# Altium footprint library connectors_socets.pcblib: 567 footprints (part 29 of 36)
Each footprint in its own frame and in the unit in brackets; x right, y up, seen from the top. Pads: shape width x height; smd on the part's side, far side on the other; paste and mask are expansions set on the pad; w line width, h text height; cw(c..) or ccw(c..) is an arc to the next point about the centre after c.
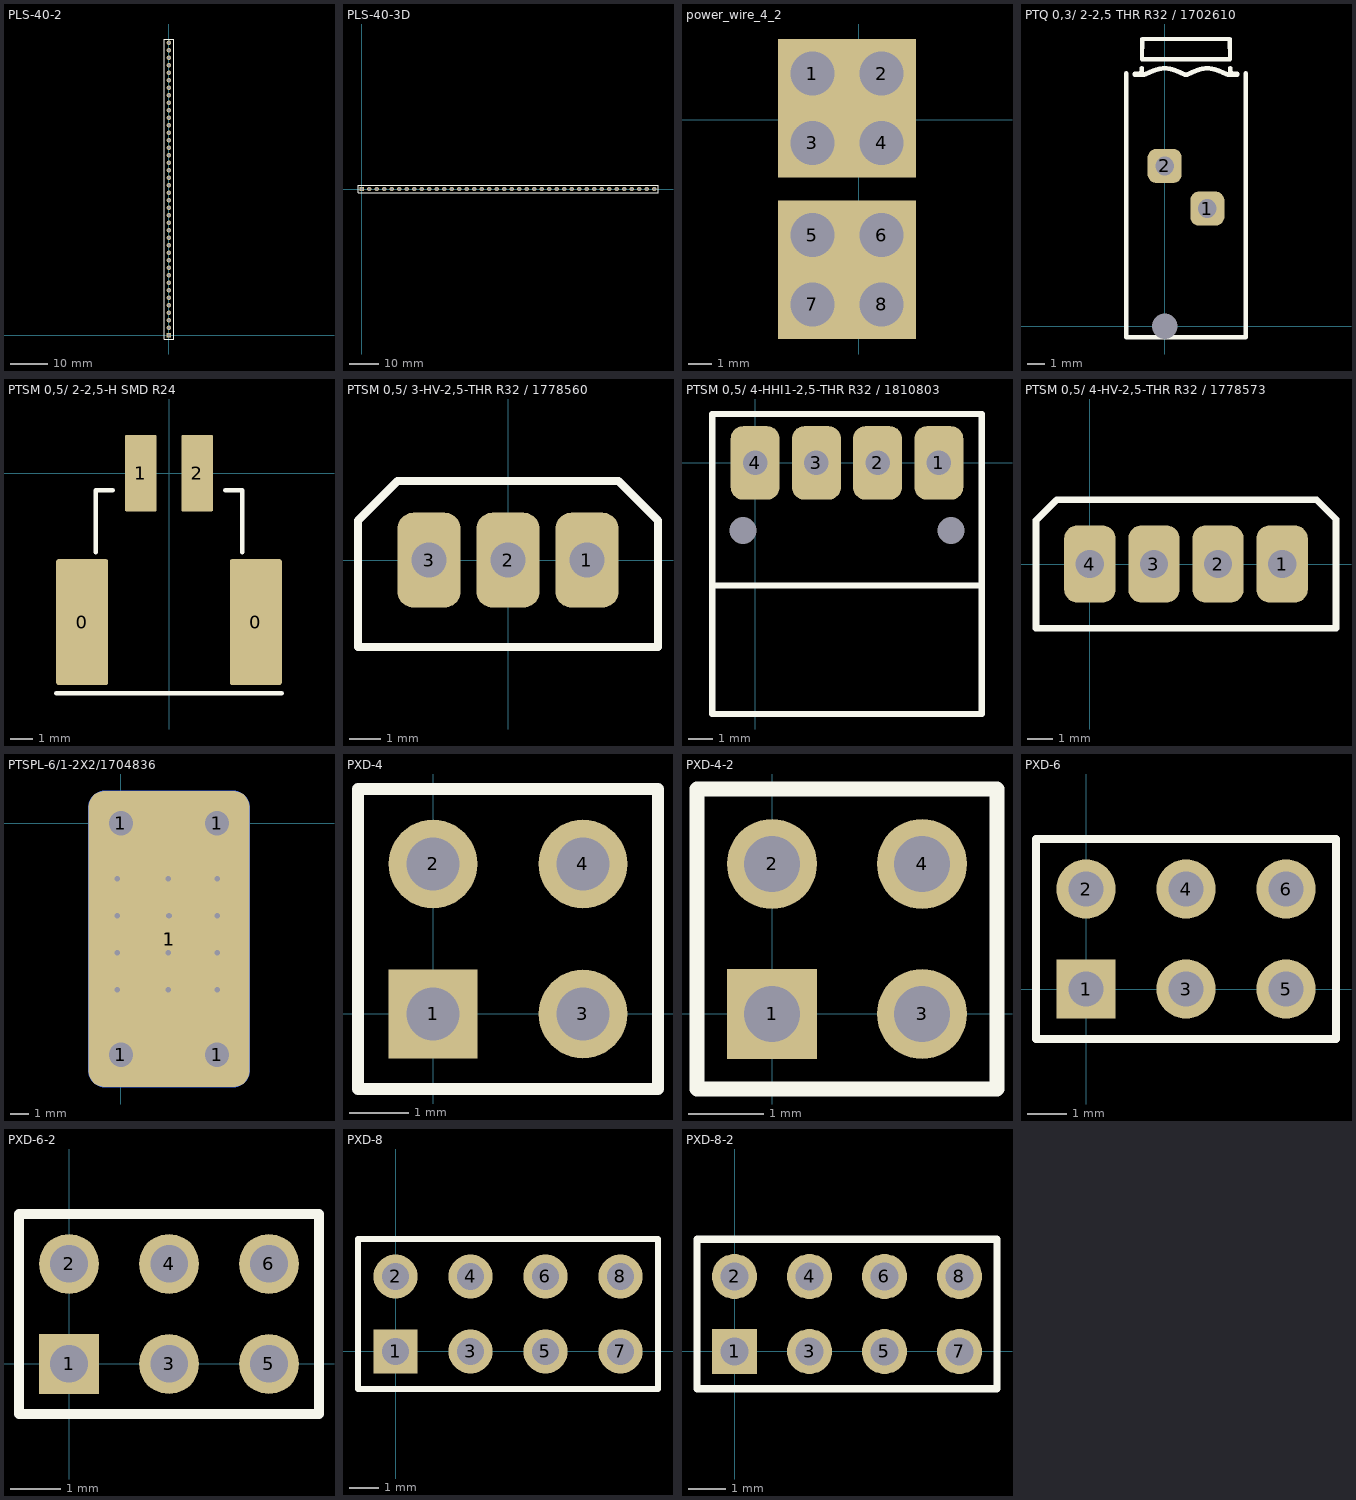
[diagram p28: the footprints below, top view; thin cyan lines are the x and y axes]

## PLS-40-2 [mm] "Connector; Header; 1x40 Position"
height 6
pads (40):
  rect 1.2x1.2 hole 0.75: 1(0,0)
  round 1.2 hole 0.75: 2(0,2) 3(0,4) 4(0,6) 5(0,8)
  round 1.2 hole 0.75 unplated: 6(0,10) 7(0,12) 8(0,14) 9(0,16) 10(0,18) 11(0,20) 12(0,22) 13(0,24) 14(0,26) 15(0,28) 16(0,30) 17(0,32) 18(0,34) 19(0,36) 20(0,38) 21(0,40) 22(0,42) 23(0,44) 24(0,46) 25(0,48) 26(0,50) 27(0,52) 28(0,54) 29(0,56) 30(0,58) 31(0,60) 32(0,62) 33(0,64) 34(0,66) 35(0,68) 36(0,70) 37(0,72) 38(0,74) 39(0,76) 40(0,78)
Top Overlay:
  lines w0.2: -1.2,-1 1.25,-1 1.25,79 -1.2,79 -1.2,-1
3D body "pls-2mm.stp": height 5.5, standoff -2.5, extent -1.2,7 1.2,9
3D body "pls-2mm.stp": height 5.5, standoff -2.5, extent -1.2,5 1.2,7
3D body "pls-2mm.stp": height 5.5, standoff -2.5, extent -1.2,3 1.2,5
3D body "pls-2mm.stp": height 5.5, standoff -2.5, extent -1.2,1 1.2,3
3D body "pls-2mm.stp": height 5.5, standoff -2.5, extent -1.2,-1 1.2,1
3D body "pls-2mm.stp": height 5.5, standoff -2.5, extent -1.2,9 1.2,11
3D body "pls-2mm.stp": height 5.5, standoff -2.5, extent -1.2,11 1.2,13
3D body "pls-2mm.stp": height 5.5, standoff -2.5, extent -1.2,13 1.2,15
3D body "pls-2mm.stp": height 5.5, standoff -2.5, extent -1.2,15 1.2,17
3D body "pls-2mm.stp": height 5.5, standoff -2.5, extent -1.2,17 1.2,19
3D body "pls-2mm.stp": height 5.5, standoff -2.5, extent -1.2,19 1.2,21
3D body "pls-2mm.stp": height 5.5, standoff -2.5, extent -1.2,21 1.2,23
3D body "pls-2mm.stp": height 5.5, standoff -2.5, extent -1.2,23 1.2,25
3D body "pls-2mm.stp": height 5.5, standoff -2.5, extent -1.2,25 1.2,27
3D body "pls-2mm.stp": height 5.5, standoff -2.5, extent -1.2,27 1.2,29
3D body "pls-2mm.stp": height 5.5, standoff -2.5, extent -1.2,29 1.2,31
3D body "pls-2mm.stp": height 5.5, standoff -2.5, extent -1.2,31 1.2,33
3D body "pls-2mm.stp": height 5.5, standoff -2.5, extent -1.2,33 1.2,35
3D body "pls-2mm.stp": height 5.5, standoff -2.5, extent -1.2,35 1.2,37
3D body "pls-2mm.stp": height 5.5, standoff -2.5, extent -1.2,37 1.2,39
3D body "pls-2mm.stp": height 5.5, standoff -2.5, extent -1.2,39 1.2,41
3D body "pls-2mm.stp": height 5.5, standoff -2.5, extent -1.2,41 1.2,43
3D body "pls-2mm.stp": height 5.5, standoff -2.5, extent -1.2,43 1.2,45
3D body "pls-2mm.stp": height 5.5, standoff -2.5, extent -1.2,45 1.2,47
3D body "pls-2mm.stp": height 5.5, standoff -2.5, extent -1.2,47 1.2,49
3D body "pls-2mm.stp": height 5.5, standoff -2.5, extent -1.2,49 1.2,51
3D body "pls-2mm.stp": height 5.5, standoff -2.5, extent -1.2,51 1.2,53
3D body "pls-2mm.stp": height 5.5, standoff -2.5, extent -1.2,53 1.2,55
3D body "pls-2mm.stp": height 5.5, standoff -2.5, extent -1.2,55 1.2,57
3D body "pls-2mm.stp": height 5.5, standoff -2.5, extent -1.2,57 1.2,59
3D body "pls-2mm.stp": height 5.5, standoff -2.5, extent -1.2,59 1.2,61
3D body "pls-2mm.stp": height 5.5, standoff -2.5, extent -1.2,61 1.2,63
3D body "pls-2mm.stp": height 5.5, standoff -2.5, extent -1.2,63 1.2,65
3D body "pls-2mm.stp": height 5.5, standoff -2.5, extent -1.2,65 1.2,67
3D body "pls-2mm.stp": height 5.5, standoff -2.5, extent -1.2,67 1.2,69
3D body "pls-2mm.stp": height 5.5, standoff -2.5, extent -1.2,69 1.2,71
3D body "pls-2mm.stp": height 5.5, standoff -2.5, extent -1.2,71 1.2,73
3D body "pls-2mm.stp": height 5.5, standoff -2.5, extent -1.2,73 1.2,75
3D body "pls-2mm.stp": height 5.5, standoff -2.5, extent -1.2,75 1.2,77
3D body "pls-2mm.stp": height 5.5, standoff -2.5, extent -1.2,77 1.2,79

## PLS-40-3D [mm] "Connector; Header; 40 Position"
height 7.5
pads (40):
  rect 1.5x1.5 hole 0.9: 1(0,0)
  round 1.5 hole 0.9: 2(2.54,0) 3(5.08,0) 4(7.62,0) 5(10.16,0) 6(12.7,0) 7(15.24,0) 8(17.78,0) 9(20.32,0) 10(22.86,0) 11(25.4,0) 12(27.94,0) 13(30.48,0) 14(33.02,0) 15(35.56,0) 16(38.1,0) 17(40.64,0) 18(43.18,0) 19(45.72,0) 20(48.26,0) 21(50.8,0) 22(53.34,0) 23(55.88,0) 24(58.42,0) 25(60.96,0) 26(63.5,0) 27(66.04,0) 28(68.58,0) 29(71.12,0) 30(73.66,0) 31(76.2,0) 32(78.74,0) 33(81.28,0) 34(83.82,0) 35(86.36,0) 36(88.9,0) 37(91.44,0) 38(93.98,0) 39(96.52,0) 40(99.06,0)
Top Overlay:
  lines w0.2: -1.27,-1.27 100.33,-1.27 100.33,1.27 -1.27,1.27 -1.27,-1.27
3D body "PLS-1.step": height 8.44, standoff -3, extent -1.27,-1.27 1.27,1.27
3D body "PLS-1.step": height 8.44, standoff -3, extent 1.27,-1.27 3.81,1.27
3D body "PLS-1.step": height 8.44, standoff -3, extent 3.81,-1.27 6.35,1.27
3D body "PLS-1.step": height 8.44, standoff -3, extent 6.35,-1.27 8.89,1.27
3D body "PLS-1.step": height 8.44, standoff -3, extent 8.89,-1.27 11.43,1.27
3D body "PLS-1.step": height 8.44, standoff -3, extent 11.43,-1.27 13.97,1.27
3D body "PLS-1.step": height 8.44, standoff -3, extent 13.97,-1.27 16.51,1.27
3D body "PLS-1.step": height 8.44, standoff -3, extent 16.51,-1.27 19.05,1.27
3D body "PLS-1.step": height 8.44, standoff -3, extent 19.05,-1.27 21.59,1.27
3D body "PLS-1.step": height 8.44, standoff -3, extent 21.59,-1.27 24.13,1.27
3D body "PLS-1.step": height 8.44, standoff -3, extent 24.13,-1.27 26.67,1.27
3D body "PLS-1.step": height 8.44, standoff -3, extent 26.67,-1.27 29.21,1.27
3D body "PLS-1.step": height 8.44, standoff -3, extent 29.21,-1.27 31.75,1.27
3D body "PLS-1.step": height 8.44, standoff -3, extent 31.75,-1.27 34.29,1.27
3D body "PLS-1.step": height 8.44, standoff -3, extent 34.29,-1.27 36.83,1.27
3D body "PLS-1.step": height 8.44, standoff -3, extent 36.83,-1.27 39.37,1.27
3D body "PLS-1.step": height 8.44, standoff -3, extent 39.37,-1.27 41.91,1.27
3D body "PLS-1.step": height 8.44, standoff -3, extent 41.91,-1.27 44.45,1.27
3D body "PLS-1.step": height 8.44, standoff -3, extent 44.45,-1.27 46.99,1.27
3D body "PLS-1.step": height 8.44, standoff -3, extent 46.99,-1.27 49.53,1.27
3D body "PLS-1.step": height 8.44, standoff -3, extent 49.53,-1.27 52.07,1.27
3D body "PLS-1.step": height 8.44, standoff -3, extent 52.07,-1.27 54.61,1.27
3D body "PLS-1.step": height 8.44, standoff -3, extent 54.61,-1.27 57.15,1.27
3D body "PLS-1.step": height 8.44, standoff -3, extent 57.15,-1.27 59.69,1.27
3D body "PLS-1.step": height 8.44, standoff -3, extent 59.69,-1.27 62.23,1.27
3D body "PLS-1.step": height 8.44, standoff -3, extent 62.23,-1.27 64.77,1.27
3D body "PLS-1.step": height 8.44, standoff -3, extent 64.77,-1.27 67.31,1.27
3D body "PLS-1.step": height 8.44, standoff -3, extent 67.31,-1.27 69.85,1.27
3D body "PLS-1.step": height 8.44, standoff -3, extent 69.85,-1.27 72.39,1.27
3D body "PLS-1.step": height 8.44, standoff -3, extent 72.39,-1.27 74.93,1.27
3D body "PLS-1.step": height 8.44, standoff -3, extent 74.93,-1.27 77.47,1.27
3D body "PLS-1.step": height 8.44, standoff -3, extent 77.47,-1.27 80.01,1.27
3D body "PLS-1.step": height 8.44, standoff -3, extent 80.01,-1.27 82.55,1.27
3D body "PLS-1.step": height 8.44, standoff -3, extent 82.55,-1.27 85.09,1.27
3D body "PLS-1.step": height 8.44, standoff -3, extent 85.09,-1.27 87.63,1.27
3D body "PLS-1.step": height 8.44, standoff -3, extent 87.63,-1.27 90.17,1.27
3D body "PLS-1.step": height 8.44, standoff -3, extent 90.17,-1.27 92.71,1.27
3D body "PLS-1.step": height 8.44, standoff -3, extent 92.71,-1.27 95.25,1.27
3D body "PLS-1.step": height 8.44, standoff -3, extent 95.25,-1.27 97.79,1.27
3D body "PLS-1.step": height 8.44, standoff -3, extent 97.79,-1.27 100.33,1.27

## PMW3360 [mm] "OproSesor"

## power_wire_4_2 [mm] "PCB hole for connect power cable"
pads (8):
  rect 3x3 hole 1.9: 1(-2,2) 2(1,2) 3(-2,-1) 4(1,-1) 5(-2,-5) 6(1,-5) 7(-2,-8) 8(1,-8)

## PTQ 0,3/ 2-2,5 THR R32 / 1702610 [mm]
height 5
pads (3):
  rrect50% 2x2 hole 1.1: 1(2.5,6.9) 2(0,9.4)
  rrect50% 0x0 hole 1.5 unplated: MNT(0,0)
Top Overlay:
  drawing of 1873 lines, arcs and shapes, not listed
3D body "pxc_1702610_01_PTQ-0-3-2-2-5-THR-R32_3D.stp": height 8, standoff -2, extent -2.25,-0.618 4.75,16.918

## PTSM 0,5/ 2-2,5-H SMD R24 [mm]
pads (4):
  rrect10% 2.3x5.6 smd: 0(-3.85,-6.6) 0(3.85,-6.6)
  rrect10% 1.4x3.4 smd: 1(-1.25,0) 2(1.25,0)
Top Overlay:
  lines w0.2: -5,-9.75 5,-9.75 ; -3.25,-3.5 -3.25,-0.75 -2.5,-0.75 ; 2.5,-0.75 3.25,-0.75 3.25,-3.5
3D body "1702473.stp": height 5, standoff 0, extent -4.7,-10.2 4.7,0.8

## PTSM 0,5/ 3-HV-2,5-THR R32 / 1778560 [mm]
height 5
pads (3):
  rrect50% 2x3 hole 1.1: 1(2.5,0) 2(0,0) 3(-2.5,0)
Top Overlay:
  lines w0.254: -4.75,-2.75 4.75,-2.75 4.75,1.25 3.5,2.5 -3.5,2.5 -4.75,1.25 -4.75,-2.75
3D body "pxc_1778560_02_PTSM-0-5-3-HV-2-5-THR-R32_3D.stp": height 7.6, standoff -2, extent -4.6,-2.5 4.6,2.5

## PTSM 0,5/ 4-HHI1-2,5-THR R32 / 1810803 [mm]
height 5
pads (6):
  rrect50% 2x3 hole 1: 1(7.5,0) 2(5,0) 3(2.5,0) 4(0,0)
  round 0 hole 1.1 unplated mask+0.05: MNT1(-0.5,-2.75) MNT2(8,-2.75)
Top Overlay:
  lines w0.254: -1.75,-5 9.25,-5 ; -1.75,-10.25 9.25,-10.25 9.25,2 -1.75,2 -1.75,-10.25
3D body "pxc_1810803_01_PTSM-0-5-4-HHI1-2-5-THR-R32_3D.stp": height 5.07, standoff -2.03, extent -1.7,-10.1 9.2,1.9

## PTSM 0,5/ 4-HV-2,5-THR R32 / 1778573 [mm]
height 5
pads (4):
  rrect50% 2x3 hole 1.1: 1(7.5,0) 2(5,0) 3(2.5,0) 4(0,0)
Top Overlay:
  lines w0.254: -2.05,1.75 -1.3,2.5 ; -1.3,2.5 -2.1,1.7 -2.1,-2.5 9.6,-2.5 9.6,1.75 8.85,2.5 -1.3,2.5
3D body "pxc_1778573_02_PTSM-0-5-4-HV-2-5-THR-R32_3D - ptsm_0.5-4-hv-2.5-thr.step": height 7.6, standoff -2, extent -2.1,-2.5 9.6,2.5

## PTSPL-6/1-2X2/1704836 [mm] "1 pin"
pads (6):
  rrect50% 3.5x3.5 hole 1.3 unplated: 1(0,-12.5) 1(0,0) 1(5.2,-12.5) 1(5.2,0)
  rrect20% 8.7x16 smd: 1(2.6,-6.25)
  rrect20% 8.7x16 smd far side mask+0.102: 1(2.6,-6.25)
via 5.2,-9 diameter 0.7 hole 0.3
via 5.2,-7 diameter 0.7 hole 0.3
via 5.2,-5 diameter 0.7 hole 0.3
via 5.2,-3 diameter 0.7 hole 0.3
via 2.6,-5 diameter 0.7 hole 0.3
via 2.562,-3 diameter 0.7 hole 0.3
via 2.562,-7 diameter 0.7 hole 0.3
via 2.562,-9 diameter 0.7 hole 0.3
via -0.2,-9 diameter 0.7 hole 0.3
via -0.2,-7 diameter 0.7 hole 0.3
via -0.2,-5 diameter 0.7 hole 0.3
via -0.2,-3 diameter 0.7 hole 0.3
Top Solder:
  region: 5.575,-10.65 0.05,-10.65 0.05,-10.875 1.025,-11.85 1.025,-13.225 0.75,-13.225 0.25,-13.725 0.25,-14.35 5.125,-14.35 5.125,-13.475 4.35,-12.7 4.525,-12.525 4.525,-11.825 5.075,-11.825 5.575,-11.325
  region: -0.2,-1.85 5.325,-1.85 5.325,-1.625 4.35,-0.65 4.35,0.725 4.625,0.725 5.125,1.225 5.125,1.85 0.25,1.85 0.25,0.975 1.025,0.2 0.85,0.025 0.85,-0.675 0.3,-0.675 -0.2,-1.175
Bottom Solder:
  region: -0.2,-1.85 5.325,-1.85 5.325,-1.625 4.35,-0.65 4.35,0.725 4.625,0.725 5.125,1.225 5.125,1.85 0.25,1.85 0.25,0.975 1.025,0.2 0.85,0.025 0.85,-0.675 0.3,-0.675 -0.2,-1.175
  region: 5.575,-10.65 0.05,-10.65 0.05,-10.875 1.025,-11.85 1.025,-13.225 0.75,-13.225 0.25,-13.725 0.25,-14.35 5.125,-14.35 5.125,-13.475 4.35,-12.7 4.525,-12.525 4.525,-11.825 5.075,-11.825 5.575,-11.325
3D body "pxc_1704836_00_PTSPL-6-1-2X2-2-1-R32_3D.stp": height 10.8, standoff -2.1, extent -1.775,-13.796 6.925,1.146

## PXD-4 [mm] "Connector; Header; 2x2 Position"
height 0.001
pads (4):
  rect 1.5x1.5 hole 0.9: 1(0,0)
  round 1.5 hole 0.9: 2(0,2.54) 3(2.54,0) 4(2.54,2.54)
Top Overlay:
  lines w0.2: -1.27,-1.27 3.81,-1.27 3.81,3.81 -1.27,3.81 -1.27,-1.27

## PXD-4-2 [mm] "Connector; Header; 2x2 Position"
height 0.001
pads (4):
  rect 1.2x1.2 hole 0.75: 1(0,0)
  round 1.2 hole 0.75: 2(0,2) 3(2,0) 4(2,2)
Top Overlay:
  lines w0.2: -1,-1 3,-1 3,3 -1,3 -1,-1

## PXD-6 [mm] "Connector; Header; 3x2 Position"
height 0.001
pads (6):
  rect 1.5x1.5 hole 0.9: 1(0,0)
  round 1.5 hole 0.9: 2(0,2.54) 3(2.54,0) 4(2.54,2.54) 5(5.08,0) 6(5.08,2.54)
Top Overlay:
  lines w0.2: -1.27,-1.27 -1.27,3.81 6.35,3.81 6.35,-1.27 -1.27,-1.27

## PXD-6-2 [mm] "Connector; Header; 3x2 Position"
height 0.001
pads (6):
  rect 1.2x1.2 hole 0.75: 1(0,0)
  round 1.2 hole 0.75: 2(0,2) 3(2,0) 4(2,2) 5(4,0) 6(4,2)
Top Overlay:
  lines w0.2: -1,-1 -1,3 5,3 5,-1 -1,-1

## PXD-8 [mm] "Connector; Header; 4x2 Position"
height 0.001
pads (8):
  rect 1.5x1.5 hole 0.9: 1(0,0)
  round 1.5 hole 0.9: 2(0,2.54) 3(2.54,0) 4(2.54,2.54) 5(5.08,0) 6(5.08,2.54) 7(7.62,0) 8(7.62,2.54)
Top Overlay:
  lines w0.2: -1.27,-1.27 -1.27,3.81 8.89,3.81 8.89,-1.27 -1.27,-1.27

## PXD-8-2 [mm] "Connector; Header; 4x2 Position"
height 0.001
pads (8):
  rect 1.2x1.2 hole 0.75: 1(0,0)
  round 1.2 hole 0.75: 2(0,2) 3(2,0) 4(2,2) 5(4,0) 6(4,2) 7(6,0) 8(6,2)
Top Overlay:
  lines w0.2: -1,-1 7,-1 7,3 -1,3 -1,-1